# Altium footprint library tsl_Pcblib.PcbLib: 219 footprints (part 5 of 14)
Each footprint in its own frame and in the unit in brackets; x right, y up, seen from the top. Pads: shape width x height; smd on the part's side, far side on the other; paste and mask are expansions set on the pad; w line width, h text height; cw(c..) or ccw(c..) is an arc to the next point about the centre after c.
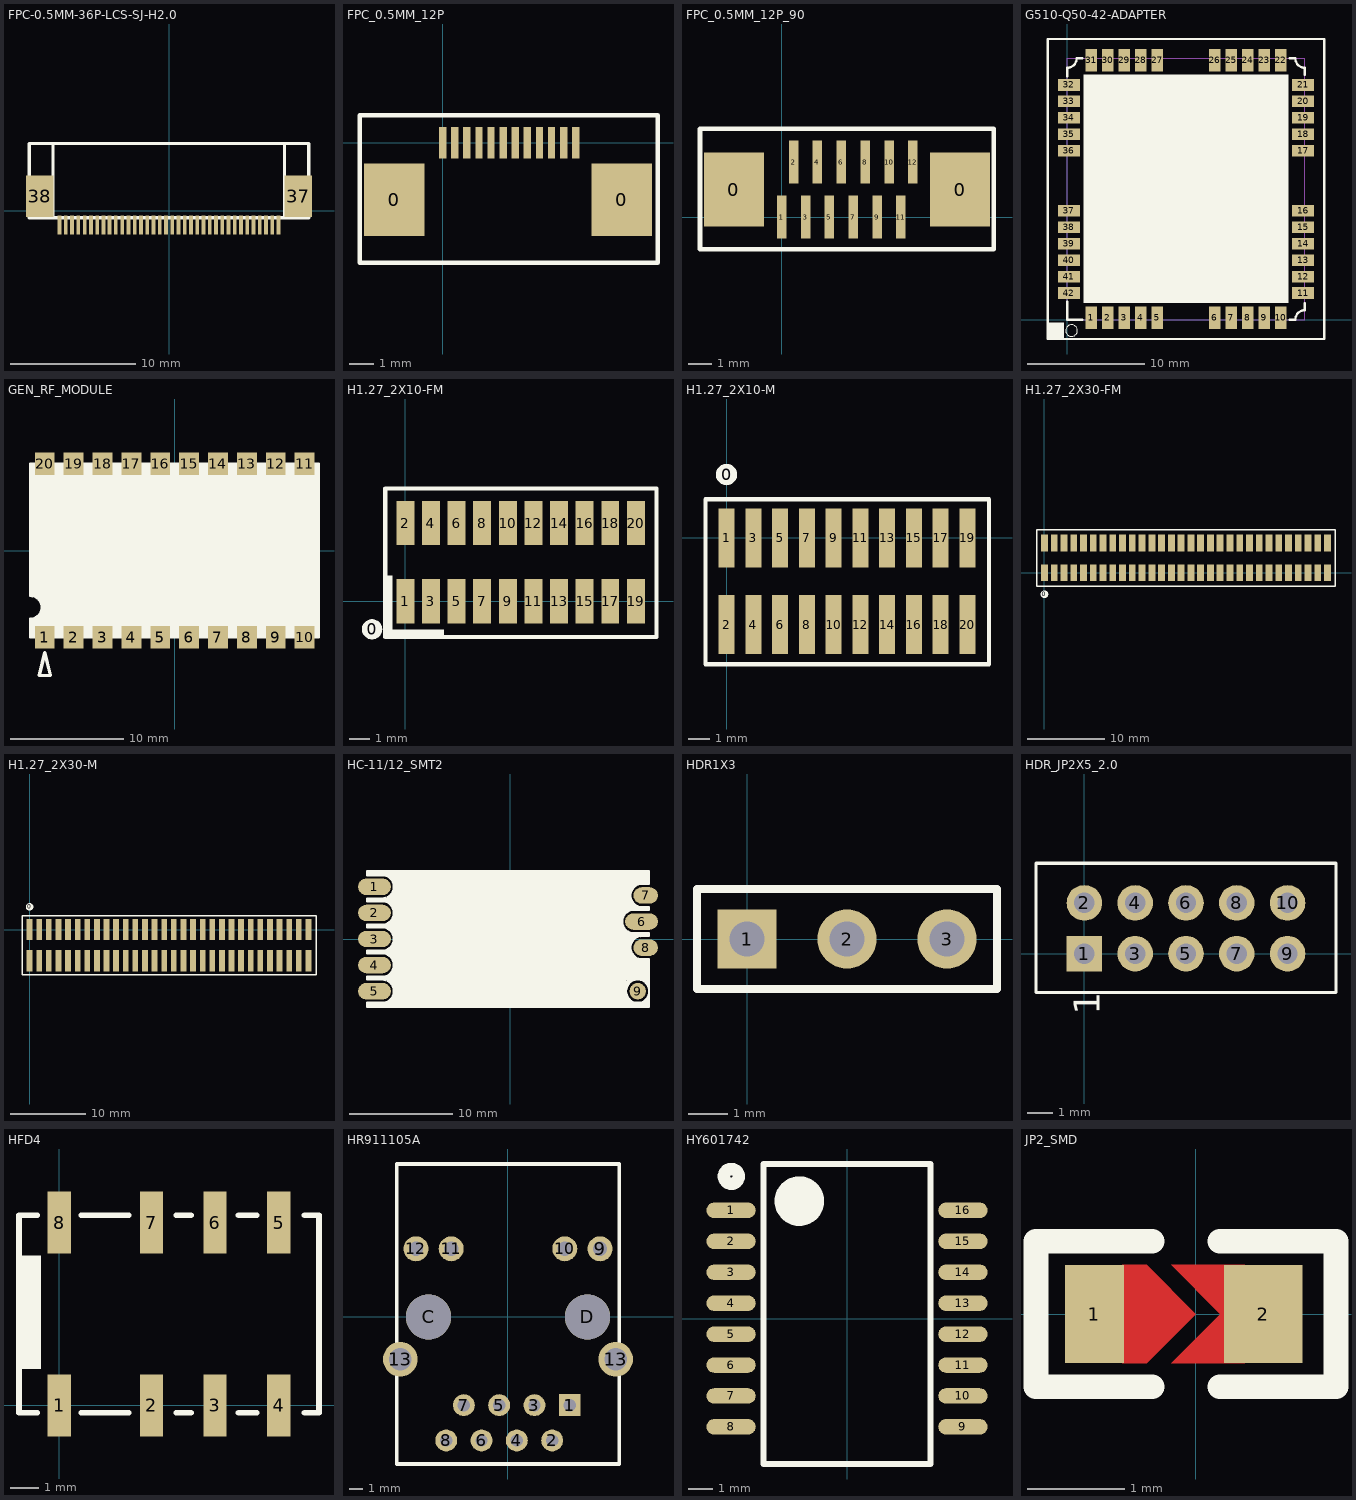
[diagram p4: the footprints below, top view; thin cyan lines are the x and y axes]

## FPC-0.5MM-36P-LCS-SJ-H2.0 [mm]
pads (38):
  rect 0.3x1.5 smd: 1(-8.749,-1.149) 2(-8.25,-1.149) 3(-7.75,-1.149) 4(-7.249,-1.149) 5(-6.749,-1.149) 6(-6.248,-1.149) 7(-5.748,-1.149) 8(-5.249,-1.149) 9(-4.75,-1.149) 10(-4.249,-1.149) 11(-3.749,-1.149) 12(-3.249,-1.149) 13(-2.748,-1.149) 14(-2.249,-1.149) 15(-1.749,-1.149) 16(-1.25,-1.149) 17(-0.749,-1.149) 18(-0.249,-1.149) 19(0.251,-1.149) 20(0.752,-1.149) 21(1.252,-1.149) 22(1.75,-1.149) 23(2.25,-1.149) 24(2.751,-1.149) 25(3.251,-1.149) 26(3.752,-1.149) 27(4.252,-1.149) 28(4.751,-1.149) 29(5.25,-1.149) 30(5.751,-1.149) 31(6.251,-1.149) 32(6.751,-1.149) 33(7.252,-1.151) 34(7.752,-1.151) 35(8.252,-1.151) 36(8.75,-1.149)
  rect 2.2x3.3 smd: 37(10.348,1.151) 38(-10.348,1.151)
Top Overlay:
  lines w0.254: -11.178,-0.568 -11.178,5.352 11.179,5.352 11.179,-0.568 -11.168,-0.568 ; -9.289,-0.568 -9.289,5.352 ; 9.251,-0.561 9.251,5.35

## FPC_0.5MM_12P [mm]
pads (14):
  rect 2.5x3 smd mask+0.051: 0(-2,-2.35) 0(7.4,-2.35)
  rect 0.3x1.3 smd mask+0.051: 1(0,0) 2(0.5,0) 3(1,0) 4(1.5,0) 5(2,0) 6(2.5,0) 7(3,0) 8(3.5,0) 9(4,0) 10(4.5,0) 11(5,0) 12(5.5,0)
Top Overlay:
  lines w0.203: -3.429,-4.953 8.89,-4.953 8.89,1.143 -3.429,1.143 -3.429,-4.953
3D body "1-1734839-2.stp": height 2, standoff -0.05, extent -2.972,-5.344 8.458,-0.234

## FPC_0.5MM_12P_90 [mm]
pads (14):
  rect 2.5x3.1 smd mask+0.051: 0(-2,1.155) 0(7.476,1.155)
  rect 0.4x1.8 smd mask+0.051: 1(0,0) 2(0.5,2.311) 3(1,0) 4(1.5,2.311) 5(2,0) 6(2.5,2.311) 7(3,0) 8(3.5,2.311) 9(4,0) 10(4.5,2.311) 11(5,0) 12(5.5,2.311)
Top Overlay:
  lines w0.203: -3.429,-1.346 8.89,-1.346 8.89,3.708 -3.429,3.708 -3.429,-1.346
3D body "0.5 FPC ZIF SMT 12W.stp": height 5.3, standoff 0, extent -3.124,-0.455 8.576,3.045

## G510-Q50-42-ADAPTER [mm]
pads (42):
  rect 1x1.9 smd mask+0.05: 1(2.05,0.15) 2(3.45,0.15) 3(4.85,0.15) 4(6.25,0.15) 5(7.65,0.15) 6(12.55,0.15) 7(13.95,0.15) 8(15.35,0.15) 9(16.75,0.15) 10(18.15,0.15) 22(18.15,22.05) 23(16.75,22.05) 24(15.35,22.05) 25(13.95,22.05) 26(12.55,22.05) 27(7.65,22.05) 28(6.25,22.05) 29(4.85,22.05) 30(3.45,22.05) 31(2.05,22.05)
  rect 1.9x1 smd mask+0.05: 11(20.05,2.25) 12(20.05,3.65) 13(20.05,5.05) 14(20.05,6.45) 15(20.05,7.85) 16(20.05,9.25) 17(20.05,14.35) 18(20.05,15.75) 19(20.05,17.15) 20(20.05,18.55) 21(20.05,19.95) 32(0.15,19.95) 33(0.15,18.55) 34(0.15,17.15) 35(0.15,15.75) 36(0.15,14.35) 37(0.15,9.25) 38(0.15,7.85) 39(0.15,6.45) 40(0.15,5.05) 41(0.15,3.65) 42(0.15,2.25)
Top Overlay:
  circle w0.1: c0.375,-0.935 r0.495
  rectangle: -1.651,-1.651 -0.254,-0.254
  rectangle: 1.397,1.397 18.796,20.828
  lines w0.2: 0,21.4 ccw(c0,22.2) 0.8,22.2 ; 19.4,0 cw(c20.2,0) 20.2,0.8 ; 19.4,22.2 ccw(c20.2,22.2) 20.2,21.4
  lines w0.203: -1.651,21.082 -1.651,23.851 1.397,23.851 21.851,23.851 21.851,23.241 ; -1.651,21.336 -1.651,0.635 -1.651,-1.651 0.381,-1.651 21.082,-1.651 21.851,-1.651 21.851,2.794 21.851,23.495 ; 0,1.524 0,0 1.27,0 ; 0,20.701 0,21.4 ; 0.8,22.2 1.27,22.2 1.27,22.225 ; 18.923,0 19.4,0 ; 18.923,22.2 19.4,22.2 ; 20.193,1.397 20.193,0.8 ; 20.193,20.828 20.193,21.4 20.2,21.4 ; 20.193,0.8 20.2,0.8 20.193,0.8
Keep-Out Layer:
  circle w0.1: c4.826,3.556 r1.8
Mechanical 20:
  lines w0.001: 0,0 20.2,0 20.2,22.2 0,22.2 0,0
3D body: height 2.4, standoff 0.2, extent 0,0 20.193,22.226

## GEN_RF_MODULE [mm]
pads (20):
  rect 1.75x2 smd: 1(-11.43,-7.625) 2(-8.89,-7.625) 3(-6.35,-7.625) 4(-3.81,-7.625) 5(-1.27,-7.625) 6(1.27,-7.625) 7(3.81,-7.625) 8(6.35,-7.625) 9(8.89,-7.625) 10(11.43,-7.625) 11(11.43,7.625) 12(8.89,7.625) 13(6.35,7.625) 14(3.81,7.625) 15(1.27,7.625) 16(-1.27,7.625) 17(-3.81,7.625) 18(-6.35,7.625) 19(-8.89,7.625) 20(-11.43,7.625)
Top Overlay:
  region: -12.7,7.625 -12.7,-3.991 -12.439,-4.026 -12.196,-4.127 -11.987,-4.287 -11.827,-4.496 -11.726,-4.739 -11.691,-5 -11.726,-5.261 -11.827,-5.504 -11.987,-5.713 -12.196,-5.873 -12.439,-5.974 -12.7,-6.009 -12.7,-6 -12.7,-7.625 12.7,-7.625 12.7,7.625
  lines w0.2: -12.7,-7.625 -12.7,-6 ccw(c-12.7,-5) -12.7,-4 -12.7,7.625 12.7,7.625 12.7,-7.625 -12.7,-7.625
  lines w0.3: -11.93,-11 -11.43,-9 -10.93,-11 -11.93,-11

## H1.27_2X10-FM [mil]
pads (21):
  round 40 on Top Overlay: 0(-65,-55)
  rect 35x86.61 smd: 1(0,0) 2(0,152.44) 3(50,0) 4(50,152.44) 5(100,0) 6(100,152.44) 7(150,0) 8(150,152.44) 9(200,0) 10(200,152.44) 11(250,0) 12(250,152.44) 13(300,0) 14(300,152.44) 15(350,0) 16(350,152.44) 17(400,0) 18(400,152.44) 19(450,0) 20(450,152.44)
Top Overlay:
  region: -25,-70 -25,50 -40,50 -40,-70
  rectangle: -40,-70 75,-55
  lines w8: -39.37,-70 -39.37,220 490,220 490,-70 -39.37,-70

## H1.27_2X10-M [mil]
height 53.15
pads (21):
  round 40 on Top Overlay: 0(0,118.11)
  rect 30x110.24 smd: 1(0,0) 2(0,-162.22) 3(50,0) 4(50,-162.22) 5(100,0) 6(100,-162.22) 7(150,0) 8(150,-162.22) 9(200,0) 10(200,-162.22) 11(250,0) 12(250,-162.22) 13(300,0) 14(300,-162.22) 15(350,0) 16(350,-162.22) 17(400,0) 18(400,-162.22) 19(450,0) 20(450,-162.22)
Top Overlay:
  lines w8: -39.37,-236 -39.37,72 490,72 490,-236 -39.37,-236

## H1.27_2X30-FM [mil]
pads (61):
  round 40 on Top Overlay: 0(0,-110)
  rect 35x86.61 smd: 1(0,0) 2(0,152.44) 3(50,0) 4(50,152.44) 5(100,0) 6(100,152.44) 7(150,0) 8(150,152.44) 9(200,0) 10(200,152.44) 11(250,0) 12(250,152.44) 13(300,0) 14(300,152.44) 15(350,0) 16(350,152.44) 17(400,0) 18(400,152.44) 19(450,0) 20(450,152.44) 21(500,0) 22(500,152.44) 23(550,0) 24(550,152.44) 25(600,0) 26(600,152.44) 27(650,0) 28(650,152.44) 29(700,0) 30(700,152.44) 31(750,0) 32(750,152.44) 33(800,0) 34(800,152.44) 35(850,0) 36(850,152.44) 37(900,0) 38(900,152.44) 39(950,0) 40(950,152.44) 41(1000,0) 42(1000,152.44) 43(1050,0) 44(1050,152.44) 45(1100,0) 46(1100,152.44) 47(1150,0) 48(1150,152.44) 49(1200,0) 50(1200,152.44) 51(1250,0) 52(1250,152.44) 53(1300,0) 54(1300,152.44) 55(1350,0) 56(1350,152.44) 57(1400,0) 58(1400,152.44) 59(1450,0) 60(1450,152.44)
Top Overlay:
  lines w8: -39.37,-70 -39.37,220 1490,220 1490,-70 -39.37,-70
3D body: height 169.29, standoff 0, extent -30,-20 1480,180

## H1.27_2X30-M [mil]
height 53.15
pads (61):
  round 40 on Top Overlay: 0(0,118.11)
  rect 30x110.24 smd: 1(0,0) 2(0,-162.22) 3(50,0) 4(50,-162.22) 5(100,0) 6(100,-162.22) 7(150,0) 8(150,-162.22) 9(200,0) 10(200,-162.22) 11(250,0) 12(250,-162.22) 13(300,0) 14(300,-162.22) 15(350,0) 16(350,-162.22) 17(400,0) 18(400,-162.22) 19(450,0) 20(450,-162.22) 21(500,0) 22(500,-162.22) 23(550,0) 24(550,-162.22) 25(600,0) 26(600,-162.22) 27(650,0) 28(650,-162.22) 29(700,0) 30(700,-162.22) 31(750,0) 32(750,-162.22) 33(800,0) 34(800,-162.22) 35(850,0) 36(850,-162.22) 37(900,0) 38(900,-162.22) 39(950,0) 40(950,-162.22) 41(1000,0) 42(1000,-162.22) 43(1050,0) 44(1050,-162.22) 45(1100,0) 46(1100,-162.22) 47(1150,0) 48(1150,-162.22) 49(1200,0) 50(1200,-162.22) 51(1250,0) 52(1250,-162.22) 53(1300,0) 54(1300,-162.22) 55(1350,0) 56(1350,-162.22) 57(1400,0) 58(1400,-162.22) 59(1450,0) 60(1450,-162.22)
Top Overlay:
  lines w8: -39.37,-236 -39.37,72 1490,72 1490,-236 -39.37,-236
3D body: height 169.29, standoff 0, extent -30,-180 1480,20

## HC-11/12_SMT2 [mm]
pads (9):
  oval 3.2x1.6 smd: 1(-13.2,5.08) 2(-13.2,2.54) 3(-13.2,0) 4(-13.2,-2.54) 5(-13.2,-5.08) 6(12.8,1.7)
  oval 2.4x1.6 smd: 7(13.2,4.24) 8(13.2,-0.84)
  round 1.6 smd: 9(12.426,-5.08)
Top Overlay:
  circle w0.152: c12.426,-5.08 r1.1
  rectangle: -11.4,-6.625 11,6.625
  rectangle: -13.95,6.15 -11.3,6.625
  rectangle: -13.95,3.6 -11.25,3.98
  rectangle: -13.95,1.1 -11.2,1.44
  rectangle: -13.95,-1.45 -11.05,-1.1
  rectangle: -13.95,-4 -10.9,-3.64
  rectangle: -13.95,-6.625 -11.25,-6.18
  rectangle: 9.5,5.35 13.55,6.625
  rectangle: 10,2.75 13.55,3.14
  rectangle: 9.7,0.25 13.55,0.6
  rectangle: 10.05,-4 13.55,-1.94
  rectangle: 10.5,-6.625 13.55,-6.2
  rectangle: 11,-6.25 11.35,-3.95
  rectangle: 11,-2.15 11.8,0.3
  rectangle: 10.95,2.95 11.8,5.35
  rectangle: 13.35,-6.625 13.55,-5.55
  rectangle: 12.85,-4.15 13.55,-3.9
  rectangle: 13.35,-4.6 13.55,-4.05
  lines w0.152: -13.95,-6.625 13.55,-6.625 13.55,-1.94 12.85,-1.94 cw(c12.85,-0.84) 12.85,0.26 13.55,0.26 13.55,0.6 12.05,0.6 cw(c12.05,1.7) 12.05,2.8 13.55,2.8 13.55,3.14 12.85,3.14 cw(c12.85,4.24) 12.85,5.34 13.55,5.34 13.55,6.625 -13.95,6.625 -13.95,6.18 -12.45,6.18 cw(c-12.45,5.08) -12.45,3.98 -13.95,3.98 -13.95,3.64 -12.45,3.64 cw(c-12.45,2.54) -12.45,1.44 -13.95,1.44 -13.95,1.1 -12.45,1.1 cw(c-12.45,0) -12.45,-1.1 -13.95,-1.1 -13.95,-1.44 -12.45,-1.44 cw(c-12.45,-2.54) -12.45,-3.64 -13.95,-3.64 -13.95,-3.98 -12.45,-3.98 cw(c-12.45,-5.08) -12.45,-6.18 -13.95,-6.18 -13.95,-6.625
  lines w0.305: 13.1,-4 13.45,-4.35
  lines w0.5: -11.8,-6.26 -11.3,-5.76 ; -11.8,-3.9 -11.3,-4.4 ; -11.8,-3.72 -11.3,-3.22 ; -11.8,-1.36 -11.3,-1.86 ; -11.8,-1.18 -11.3,-0.68 ; -11.8,1.18 -11.3,0.68 ; -11.8,1.36 -11.3,1.86 ; -11.8,3.72 -11.3,3.22 ; -11.8,3.9 -11.3,4.4 ; -11.8,6.26 -11.3,5.76 ; 10.9,1.02 11.4,0.52 ; 10.9,2.38 11.4,2.88 ; 11.3,-5.8 11.8,-6.3 ; 11.3,-4.4 11.8,-3.9 ; 11.7,-1.5 12.2,-2 ; 11.7,-0.1 12.2,0.4 ; 11.75,3.5 12.25,3 ; 11.75,4.95 12.25,5.45 ; 12.85,-6.45 13.35,-5.95

## HDR1X3 [mm]
pads (3):
  rect 1.5x1.5 hole 0.9: 1(0,0)
  round 1.5 hole 0.9: 2(2.54,0) 3(5.08,0)
Top Overlay:
  lines w0.2: -1.27,-1.27 6.35,-1.27 6.35,1.27 -1.27,1.27 -1.27,-1.27

## HDR_JP2X5_2.0 [mm]
pads (10):
  rect 1.4x1.4 hole 0.8: 1(0,0)
  round 1.4 hole 0.8: 2(0,2) 3(2,0) 4(2,2) 5(4,0) 6(4,2) 7(6,0) 8(6,2) 9(8,0) 10(8,2)
Top Overlay:
  lines w0.127: 2.176,-1.524 6.176,-1.524 ; 2.176,-1.524 -1.905,-1.524 -1.905,3.556 9.906,3.556 9.906,-1.524 6.176,-1.524 ; 2.176,-1.524 6.176,-1.524
  text "1" at 0.6,-2.4 h1.02

## HFD4 [mm]
pads (8):
  rect 0.8x2.15 smd: 1(0,0) 2(3.2,0) 3(5.4,0) 4(7.62,0) 5(7.62,6.35) 6(5.4,6.35) 7(3.2,6.35) 8(0,6.35)
Top Overlay:
  rectangle: -1.397,1.27 -0.635,5.207
  lines w0.203: -0.762,-0.254 -1.397,-0.254 -1.397,6.604 -0.762,6.604 ; 0.762,-0.254 2.413,-0.254 ; 0.762,6.604 2.413,6.604 ; 4.064,-0.254 4.572,-0.254 ; 4.064,6.604 4.572,6.604 ; 6.223,-0.254 6.858,-0.254 ; 6.223,6.604 6.858,6.604 ; 8.509,-0.254 9.017,-0.254 9.017,6.604 8.509,6.604

## HR911105A [mm]
pads (16):
  rect 1.575x1.575 hole 0.889: 1(4.449,-6.345)
  round 1.575 hole 0.889: 2(3.179,-8.885) 3(1.909,-6.345) 4(0.639,-8.885) 5(-0.631,-6.345) 6(-1.901,-8.885) 7(-3.171,-6.345) 8(-4.441,-8.885)
  round 1.8 hole 1.02: 9(6.629,4.905) 10(4.089,4.905) 11(-4.081,4.905) 12(-6.621,4.905)
  round 2.5 hole 1.63: 13(-7.741,-3.045) 13(7.749,-3.045)
  round 3.25 hole 3.25: C(-5.711,0.005) D(5.719,0.005)
Top Overlay:
  lines w0.254: -7.996,-10.578 8.004,-10.578 8.004,11.005 -7.996,11.005 -7.996,-10.578
Bottom Overlay:
  text "7" at -2.794,-3.81 h2
  text "1" at 4.699,-3.937 h2
3D body "User Library-HR911105A.step": height 13.5, standoff -3, extent -7.94,-10.414 7.94,10.986

## HY601742 [mil]
height 544.49
pads (16):
  oval 80x25 smd: 1(-187.5,175) 2(-187.5,125) 3(-187.5,75) 4(-187.5,25) 5(-187.5,-25) 6(-187.5,-75) 7(-187.5,-125) 8(-187.5,-175) 9(187.5,-175) 10(187.5,-125) 11(187.5,-75) 12(187.5,-25) 13(187.5,25) 14(187.5,75) 15(187.5,125) 16(187.5,175)
Top Overlay:
  circle w20: c-187,230 r12
  circle w20: c-187,230 r12
  circle w40: c-77,190 r20
  lines w10: -135,-235 135,-235 135,250 -135,250 -135,-235

## JP2_SMD [mil]
height 78.74
pads (2):
  rect 24.13x40 smd: 1(-41.25,0)
  rect 32x40 smd: 2(27.5,0)
Top Layer:
  region: 20,0 10,0 -10,20 20,20
  region: 20,0 10,0 -10,-20 20,-20
  region: -30,-20 -20,-20 0,0 -20,20 -30,20
Top Overlay:
  lines w10: -17.78,-29.53 -65.02,-29.53 -65.02,29.53 -17.78,29.53 ; 9.78,-29.53 57.03,-29.53 57.03,29.53 9.78,29.53
Top Paste:
  region: 20,0 10,0 -10,20 20,20
  region: 20,0 10,0 -10,-20 20,-20
  region: -30,-20 -20,-20 0,0 -20,20 -30,20
Top Solder:
  region: 20,0 6,0 -18,24 20,24
  region: 20,0 6,0 -18,-24 20,-24
  region: -30,-24 -20,-24 4,0 -20,24 -30,24